# Altium schematic symbol library FPGA_Xilinx_Virtex7.SchLib: 34 symbols (part 11 of 34)
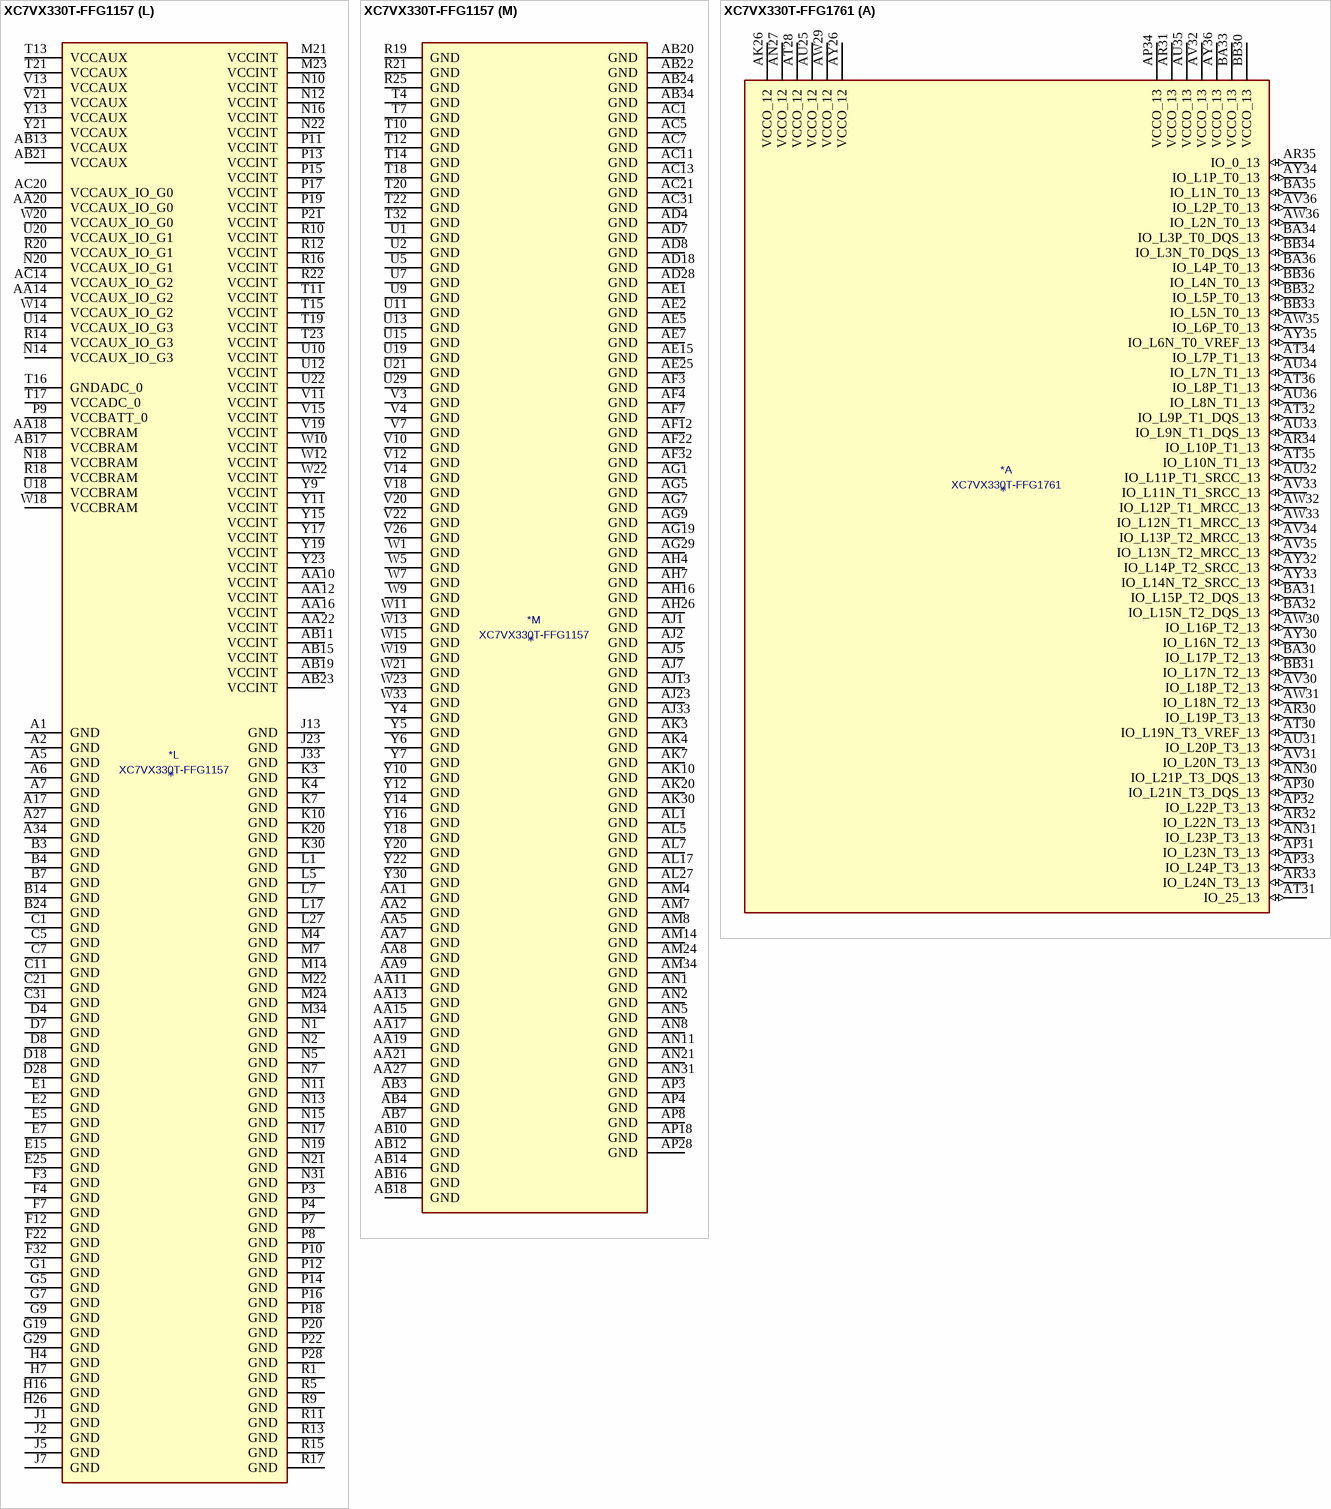
[diagram p182: symbols XC7VX330T-FFG1157 to XC7VX330T-FFG1761]

## XC7VX330T-FFG1157
designator *  value XC7VX330T-FFG1157
ki_keywords: FPGA; ki_description: Virtex 7 XT 330 XC7VX330T-FFG1157
part A pins: AC23 IO_25_VRP_15 (io), AC24 IO_L24P_T3_RS1_15 (io), AC25 IO_L23P_T3_FOE_B_15 (io), AC26 VCCO_15 (power), AC27 IO_0_VRN_15 (io), AC28 IO_L15P_T2_DQS_15 (io), AC29 IO_L15N_T2_DQS_ADV_B_15 (io), AC30 IO_L8P_T1_AD10P_15 (io), AD23 VCCO_15 (power), AD24 IO_L24N_T3_RS0_15 (io), AD25 IO_L23N_T3_FWE_B_15 (io), AD26 IO_L19P_T3_A22_15 (io), AD27 IO_L19N_T3_A21_VREF_15 (io), AD29 IO_L13P_T2_MRCC_15 (io), AD30 IO_L8N_T1_AD10N_15 (io), AD31 IO_L10P_T1_AD11P_15 (io), AD32 IO_L10N_T1_AD11N_15 (io), AD33 VCCO_15 (power), AD34 IO_L2P_T0_AD8P_15 (io), AE23 IO_L22P_T3_A17_15 (io), AE24 IO_L22N_T3_A16_15 (io), AE26 IO_L21P_T3_DQS_15 (io), AE27 IO_L16P_T2_A28_15 (io), AE28 IO_L14P_T2_SRCC_15 (io), AE29 IO_L13N_T2_MRCC_15 (io), AE30 VCCO_15 (power), AE31 IO_L12P_T1_MRCC_15 (io), AE32 IO_L7P_T1_AD2P_15 (io), AE33 IO_L7N_T1_AD2N_15 (io), AE34 IO_L2N_T0_AD8N_15 (io), AF24 IO_25_VRP_14 (io), AF25 IO_0_VRN_14 (io), AF26 IO_L21N_T3_DQS_A18_15 (io), AF27 VCCO_15 (power), AF28 IO_L16N_T2_A27_15 (io), AF29 IO_L14N_T2_SRCC_15 (io), AF30 IO_L11P_T1_SRCC_15 (io), AF31 IO_L12N_T1_MRCC_15 (io), AF33 IO_L1P_T0_AD0P_15 (io), AF34 IO_L1N_T0_AD0N_15 (io), AG24 VCCO_14 (power), AG25 IO_L16P_T2_CSI_B_14 (io), AG26 IO_L20P_T3_A20_15 (io), AG27 IO_L20N_T3_A19_15 (io), AG28 IO_L17P_T2_A26_15 (io), AG30 IO_L9P_T1_DQS_AD3P_15 (io), AG31 IO_L11N_T1_SRCC_15 (io), AG32 IO_L3P_T0_DQS_AD1P_15 (io), AG33 IO_L6P_T0_15 (io), AG34 VCCO_15 (power), AH24 IO_L17P_T2_A14_D30_14 (io), AH25 IO_L16N_T2_A15_D31_14 (io), AH27 IO_L18P_T2_A24_15 (io), AH28 IO_L18N_T2_A23_15 (io), AH29 IO_L17N_T2_A25_15 (io), AH30 IO_L9N_T1_DQS_AD3N_15 (io), AH31 VCCO_15 (power), AH32 IO_L3N_T0_DQS_AD1N_15 (io), AH33 IO_L6N_T0_VREF_15 (io), AH34 IO_L4P_T0_15 (io), AJ25 IO_L17N_T2_A13_D29_14 (io), AJ26 IO_L15P_T2_DQS_RDWR_B_14 (io), AJ27 IO_L15N_T2_DQS_DOUT_CSO_B_14 (io), AJ28 VCCO_14 (power), AJ29 IO_L10P_T1_D14_14 (io), AJ30 IO_L8P_T1_D11_14 (io), AJ31 IO_L5P_T0_AD9P_15 (io), AJ32 IO_L5N_T0_AD9N_15 (io), AJ34 IO_L4N_T0_15 (io), AK26 IO_L14P_T2_SRCC_14 (io), AK27 IO_L14N_T2_SRCC_14 (io), AK28 IO_L13P_T2_MRCC_14 (io), AK29 IO_L10N_T1_D15_14 (io), AK31 IO_L8N_T1_D12_14 (io), AK32 IO_L4P_T0_D04_14 (io), AK33 IO_L4N_T0_D05_14 (io), AK34 IO_L2P_T0_D02_14 (io), AL25 IO_L18P_T2_A12_D28_14 (io), AL26 IO_L18N_T2_A11_D27_14 (io), AL28 IO_L13N_T2_MRCC_14 (io), AL29 IO_L12P_T1_MRCC_14 (io), AL30 IO_L12N_T1_MRCC_14 (io), AL31 IO_L11P_T1_SRCC_14 (io), AL32 VCCO_14 (power), AL33 IO_L6P_T0_FCS_B_14 (io), AL34 IO_L2N_T0_D03_14 (io), AM25 IO_L21P_T3_DQS_14 (io), AM26 IO_L19P_T3_A10_D26_14 (io), AM27 IO_L19N_T3_A09_D25_VREF_14 (io), AM28 IO_L22P_T3_A05_D21_14 (io), AM29 VCCO_14 (power), AM30 IO_L9P_T1_DQS_14 (io), AM31 IO_L11N_T1_SRCC_14 (io), AM32 IO_L5P_T0_D06_14 (io), AM33 IO_L6N_T0_D08_VREF_14 (io), AN25 IO_L21N_T3_DQS_A06_D22_14 (io), AN26 VCCO_14 (power), AN27 IO_L24P_T3_A01_D17_14 (io), AN28 IO_L22N_T3_A04_D20_14 (io), AN29 IO_L20P_T3_A08_D24_14 (io), AN30 IO_L9N_T1_DQS_D13_14 (io), AN32 IO_L5N_T0_D07_14 (io), AN33 IO_L1P_T0_D00_MOSI_14 (io), AN34 IO_L1N_T0_D01_DIN_14 (io), AP25 IO_L23P_T3_A03_D19_14 (io), AP26 IO_L23N_T3_A02_D18_14 (io), AP27 IO_L24N_T3_A00_D16_14 (io), AP29 IO_L20N_T3_A07_D23_14 (io), AP30 IO_L7P_T1_D09_14 (io), AP31 IO_L7N_T1_D10_14 (io), AP32 IO_L3P_T0_DQS_PUDC_B_14 (io), AP33 IO_L3N_T0_DQS_EMCCLK_14 (io), AP34 VCCO_14 (power)
part B pins: AA23 IO_L24P_T3_16 (io), AA24 IO_L24N_T3_16 (io), AA25 IO_L23N_T3_16 (io), AA26 IO_L21P_T3_DQS_16 (io), AA28 IO_L13P_T2_MRCC_16 (io), AA29 IO_L13N_T2_MRCC_16 (io), AA30 IO_L9P_T1_DQS_16 (io), AA31 IO_L11N_T1_SRCC_16 (io), AA32 VCCO_16 (power), AA33 IO_L1P_T0_16 (io), AA34 IO_L1N_T0_16 (io), AB25 IO_25_VRP_16 (io), AB26 IO_L21N_T3_DQS_16 (io), AB27 IO_L18P_T2_16 (io), AB28 IO_L18N_T2_16 (io), AB29 VCCO_16 (power), AB30 IO_L9N_T1_DQS_16 (io), AB31 IO_L7P_T1_16 (io), AB32 IO_L7N_T1_16 (io), AB33 IO_L3P_T0_DQS_16 (io), AC32 IO_L5P_T0_16 (io), AC33 IO_L5N_T0_16 (io), AC34 IO_L3N_T0_DQS_16 (io), M30 IO_L8P_T1_17 (io), M31 IO_L8N_T1_17 (io), M32 IO_L20P_T3_17 (io), M33 IO_L20N_T3_17 (io), N23 IO_0_VRN_17 (io), N24 IO_L1P_T0_17 (io), N25 IO_L1N_T0_17 (io), N26 VCCO_17 (power), N27 IO_L2P_T0_17 (io), N28 IO_L2N_T0_17 (io), N29 IO_L7P_T1_17 (io), N30 IO_L7N_T1_17 (io), N32 IO_L19N_T3_VREF_17 (io), N33 IO_L22P_T3_17 (io), N34 IO_L22N_T3_17 (io), P23 VCCO_17 (power), P24 IO_L4P_T0_17 (io), P25 IO_L4N_T0_17 (io), P26 IO_L6P_T0_17 (io), P27 IO_L6N_T0_VREF_17 (io), P29 IO_L12P_T1_MRCC_17 (io), P30 IO_L12N_T1_MRCC_17 (io), P31 IO_L11N_T1_SRCC_17 (io), P32 IO_L19P_T3_17 (io), P33 VCCO_17 (power), P34 IO_L24N_T3_17 (io), R23 IO_L3P_T0_DQS_17 (io), R24 IO_L3N_T0_DQS_17 (io), R26 IO_L15P_T2_DQS_17 (io), R27 IO_L15N_T2_DQS_17 (io), R28 IO_L13P_T2_MRCC_17 (io), R29 IO_L13N_T2_MRCC_17 (io), R30 VCCO_17 (power), R31 IO_L11P_T1_SRCC_17 (io), R32 IO_L9N_T1_DQS_17 (io), R33 IO_L24P_T3_17 (io), R34 IO_L21N_T3_DQS_17 (io), T24 IO_L5P_T0_17 (io), T25 IO_L5N_T0_17 (io), T26 IO_L18N_T2_17 (io), T27 VCCO_17 (power), T28 IO_L16N_T2_17 (io), T29 IO_L14P_T2_SRCC_17 (io), T30 IO_L14N_T2_SRCC_17 (io), T31 IO_L9P_T1_DQS_17 (io), T33 IO_L21P_T3_DQS_17 (io), T34 IO_L23N_T3_17 (io), U23 IO_25_VRP_17 (io), U24 VCCO_16 (power), U25 IO_L18P_T2_17 (io), U26 IO_L17P_T2_17 (io), U27 IO_L17N_T2_17 (io), U28 IO_L16P_T2_17 (io), U30 IO_L8P_T1_16 (io), U31 IO_L10P_T1_17 (io), U32 IO_L10N_T1_17 (io), U33 IO_L23P_T3_17 (io), U34 VCCO_17 (power), V23 IO_0_VRN_16 (io), V24 IO_L20P_T3_16 (io), V25 IO_L20N_T3_16 (io), V27 IO_L15P_T2_DQS_16 (io), V28 IO_L15N_T2_DQS_16 (io), V29 IO_L16P_T2_16 (io), V30 IO_L8N_T1_16 (io), V31 VCCO_16 (power), V32 IO_L6P_T0_16 (io), V33 IO_L6N_T0_VREF_16 (io), V34 IO_L2P_T0_16 (io), W24 IO_L22P_T3_16 (io), W25 IO_L22N_T3_16 (io), W26 IO_L17P_T2_16 (io), W27 IO_L17N_T2_16 (io), W28 VCCO_16 (power), W29 IO_L16N_T2_16 (io), W30 IO_L12P_T1_MRCC_16 (io), W31 IO_L12N_T1_MRCC_16 (io), W32 IO_L10P_T1_16 (io), W34 IO_L2N_T0_16 (io), Y24 IO_L23P_T3_16 (io), Y25 VCCO_16 (power), Y26 IO_L19P_T3_16 (io), Y27 IO_L19N_T3_VREF_16 (io), Y28 IO_L14P_T2_SRCC_16 (io), Y29 IO_L14N_T2_SRCC_16 (io), Y31 IO_L11P_T1_SRCC_16 (io), Y32 IO_L10N_T1_16 (io), Y33 IO_L4P_T0_16 (io), Y34 IO_L4N_T0_16 (io)
part C pins: A25 IO_L8P_T1_19 (io), A26 IO_L8N_T1_19 (io), A28 IO_L15P_T2_DQS_19 (io), A29 IO_L15N_T2_DQS_19 (io), A30 IO_L17P_T2_19 (io), A31 IO_L17N_T2_19 (io), A32 VCCO_19 (power), A33 IO_L3N_T0_DQS_19 (io), B25 IO_L7N_T1_19 (io), B26 IO_L10P_T1_19 (io), B27 IO_L10N_T1_19 (io), B28 IO_L12N_T1_MRCC_19 (io), B29 VCCO_19 (power), B30 IO_L13N_T2_MRCC_19 (io), B31 IO_L1P_T0_19 (io), B32 IO_L1N_T0_19 (io), B33 IO_L3P_T0_DQS_19 (io), B34 IO_L4N_T0_19 (io), C25 IO_L7P_T1_19 (io), C26 VCCO_19 (power), C27 IO_L12P_T1_MRCC_19 (io), C28 IO_L14P_T2_SRCC_19 (io), C29 IO_L14N_T2_SRCC_19 (io), C30 IO_L13P_T2_MRCC_19 (io), C32 IO_L6N_T0_VREF_19 (io), C33 IO_L4P_T0_19 (io), C34 IO_L2N_T0_19 (io), D25 IO_L23N_T3_19 (io), D26 IO_L9N_T1_DQS_19 (io), D27 IO_L11N_T1_SRCC_19 (io), D29 IO_L16P_T2_19 (io), D30 IO_L16N_T2_19 (io), D31 IO_L5N_T0_19 (io), D32 IO_L6P_T0_19 (io), D33 VCCO_19 (power), D34 IO_L2P_T0_19 (io), E24 IO_L23P_T3_19 (io), E26 IO_L9P_T1_DQS_19 (io), E27 IO_L11P_T1_SRCC_19 (io), E28 IO_L18P_T2_19 (io), E29 IO_L18N_T2_19 (io), E30 VCCO_19 (power), E31 IO_L5P_T0_19 (io), E32 IO_L8P_T1_18 (io), E33 IO_L8N_T1_18 (io), E34 IO_L10N_T1_18 (io), F24 IO_0_VRN_19 (io), F25 IO_L21N_T3_DQS_19 (io), F26 IO_L22N_T3_19 (io), F27 VCCO_19 (power), F28 IO_L24N_T3_19 (io), F29 IO_L17N_T2_18 (io), F30 IO_L9P_T1_DQS_18 (io), F31 IO_L9N_T1_DQS_18 (io), F33 IO_L10P_T1_18 (io), F34 IO_L7N_T1_18 (io), G24 VCCO_19 (power), G25 IO_L21P_T3_DQS_19 (io), G26 IO_L22P_T3_19 (io), G27 IO_L24P_T3_19 (io), G28 IO_L17P_T2_18 (io), G30 IO_L12P_T1_MRCC_18 (io), G31 IO_L12N_T1_MRCC_18 (io), G32 IO_L11N_T1_SRCC_18 (io), G33 IO_L7P_T1_18 (io), G34 VCCO_18 (power), H24 IO_L19N_T3_VREF_19 (io), H25 IO_L20N_T3_19 (io), H27 IO_0_VRN_18 (io), H28 IO_L15N_T2_DQS_18 (io), H29 IO_L13P_T2_MRCC_18 (io), H30 IO_L13N_T2_MRCC_18 (io), H31 VCCO_18 (power), H32 IO_L11P_T1_SRCC_18 (io), H33 IO_L21P_T3_DQS_18 (io), H34 IO_L21N_T3_DQS_18 (io), J24 IO_L19P_T3_19 (io), J25 IO_L20P_T3_19 (io), J26 IO_25_VRP_19 (io), J27 IO_L15P_T2_DQS_18 (io), J28 VCCO_18 (power), J29 IO_L16N_T2_18 (io), J30 IO_L14P_T2_SRCC_18 (io), J31 IO_L14N_T2_SRCC_18 (io), J32 IO_L19N_T3_VREF_18 (io), J34 IO_L23N_T3_18 (io), K23 IO_L1N_T0_18 (io), K24 IO_L3N_T0_DQS_18 (io), K25 VCCO_18 (power), K26 IO_L5P_T0_18 (io), K27 IO_L5N_T0_18 (io), K28 IO_L16P_T2_18 (io), K29 IO_L18N_T2_18 (io), K31 IO_L19P_T3_18 (io), K32 IO_L20P_T3_18 (io), K33 IO_L20N_T3_18 (io), K34 IO_L23P_T3_18 (io), L22 VCCO_18 (power), L23 IO_L1P_T0_18 (io), L24 IO_L3P_T0_DQS_18 (io), L25 IO_L6N_T0_VREF_18 (io), L26 IO_L4N_T0_18 (io), L28 IO_L2N_T0_18 (io), L29 IO_L18P_T2_18 (io), L30 IO_L24P_T3_18 (io), L31 IO_L24N_T3_18 (io), L32 VCCO_18 (power), L33 IO_L22P_T3_18 (io), L34 IO_L22N_T3_18 (io), M25 IO_L6P_T0_18 (io), M26 IO_L4P_T0_18 (io), M27 IO_L2P_T0_18 (io), M28 IO_25_VRP_18 (io), M29 VCCO_18 (power)
part D pins: AC9 IO_L2N_T0_34 (io), AC10 IO_L2P_T0_34 (io), AC12 IO_0_VRN_34 (io), AC15 IO_25_VRP_35 (io), AC16 VCCO_35 (power), AC17 IO_L22P_T3_35 (io), AD9 IO_L4N_T0_34 (io), AD10 IO_L4P_T0_34 (io), AD11 IO_L6N_T0_VREF_34 (io), AD12 IO_L6P_T0_34 (io), AD13 VCCO_34 (power), AD14 IO_L23P_T3_35 (io), AD15 IO_L24N_T3_35 (io), AD16 IO_L24P_T3_35 (io), AD17 IO_L22N_T3_35 (io), AE8 IO_L1N_T0_34 (io), AE9 IO_L1P_T0_34 (io), AE10 VCCO_34 (power), AE11 IO_L3N_T0_DQS_34 (io), AE12 IO_L3P_T0_DQS_34 (io), AE13 IO_L23N_T3_35 (io), AE14 IO_L21P_T3_DQS_35 (io), AE16 IO_L20N_T3_35 (io), AE17 IO_L20P_T3_35 (io), AE18 IO_0_VRN_35 (io), AF8 IO_L5N_T0_34 (io), AF9 IO_L5P_T0_34 (io), AF10 IO_L10P_T1_34 (io), AF11 IO_L7P_T1_34 (io), AF13 IO_L19P_T3_35 (io), AF14 IO_L21N_T3_DQS_35 (io), AF15 IO_L16P_T2_35 (io), AF16 IO_L14P_T2_SRCC_35 (io), AF17 VCCO_35 (power), AF18 IO_L15P_T2_DQS_35 (io), AG8 IO_L8P_T1_34 (io), AG10 IO_L10N_T1_34 (io), AG11 IO_L7N_T1_34 (io), AG12 IO_L9P_T1_DQS_34 (io), AG13 IO_L19N_T3_VREF_35 (io), AG14 VCCO_35 (power), AG15 IO_L16N_T2_35 (io), AG16 IO_L14N_T2_SRCC_35 (io), AG17 IO_L13P_T2_MRCC_35 (io), AG18 IO_L15N_T2_DQS_35 (io), AH8 IO_L8N_T1_34 (io), AH9 IO_L12P_T1_MRCC_34 (io), AH10 IO_L11P_T1_SRCC_34 (io), AH11 VCCO_34 (power), AH12 IO_L9N_T1_DQS_34 (io), AH13 IO_25_VRP_34 (io), AH14 IO_L18P_T2_35 (io), AH15 IO_L12P_T1_MRCC_35 (io), AH17 IO_L13N_T2_MRCC_35 (io), AH18 IO_L17N_T2_35 (io), AH19 IO_L17P_T2_35 (io), AJ8 VCCO_34 (power), AJ9 IO_L12N_T1_MRCC_34 (io), AJ10 IO_L11N_T1_SRCC_34 (io), AJ11 IO_L13P_T2_MRCC_34 (io), AJ12 IO_L14P_T2_SRCC_34 (io), AJ14 IO_L18N_T2_35 (io), AJ15 IO_L12N_T1_MRCC_35 (io), AJ16 IO_L11P_T1_SRCC_35 (io), AJ17 IO_L10P_T1_AD15P_35 (io), AJ18 VCCO_35 (power), AK8 IO_L15P_T2_DQS_34 (io), AK9 IO_L17P_T2_34 (io), AK11 IO_L13N_T2_MRCC_34 (io), AK12 IO_L14N_T2_SRCC_34 (io), AK13 IO_L24P_T3_34 (io), AK14 IO_L9P_T1_DQS_AD7P_35 (io), AK15 VCCO_35 (power), AK16 IO_L11N_T1_SRCC_35 (io), AK17 IO_L10N_T1_AD15N_35 (io), AK18 IO_L8P_T1_AD14P_35 (io), AL8 IO_L15N_T2_DQS_34 (io), AL9 IO_L17N_T2_34 (io), AL10 IO_L16P_T2_34 (io), AL11 IO_L18P_T2_34 (io), AL12 VCCO_34 (power), AL13 IO_L24N_T3_34 (io), AL14 IO_L9N_T1_DQS_AD7N_35 (io), AL15 IO_L7P_T1_AD6P_35 (io), AL16 IO_L3P_T0_DQS_AD5P_35 (io), AL18 IO_L8N_T1_AD14N_35 (io), AM9 VCCO_34 (power), AM10 IO_L16N_T2_34 (io), AM11 IO_L18N_T2_34 (io), AM12 IO_L19P_T3_34 (io), AM13 IO_L23P_T3_34 (io), AM15 IO_L7N_T1_AD6N_35 (io), AM16 IO_L3N_T0_DQS_AD5N_35 (io), AM17 IO_L6P_T0_35 (io), AM18 IO_L2P_T0_AD12P_35 (io), AN9 IO_L20P_T3_34 (io), AN10 IO_L21P_T3_DQS_34 (io), AN12 IO_L19N_T3_VREF_34 (io), AN13 IO_L23N_T3_34 (io), AN14 IO_L5P_T0_AD13P_35 (io), AN15 IO_L1P_T0_AD4P_35 (io), AN16 VCCO_35 (power), AN17 IO_L6N_T0_VREF_35 (io), AN18 IO_L2N_T0_AD12N_35 (io), AP9 IO_L20N_T3_34 (io), AP10 IO_L21N_T3_DQS_34 (io), AP11 IO_L22N_T3_34 (io), AP12 IO_L22P_T3_34 (io), AP13 VCCO_34 (power), AP14 IO_L5N_T0_AD13N_35 (io), AP15 IO_L1N_T0_AD4N_35 (io), AP16 IO_L4N_T0_35 (io), AP17 IO_L4P_T0_35 (io)
part E pins: A19 IO_L7P_T1_37 (io), A20 IO_L7N_T1_37 (io), A21 IO_L9N_T1_DQS_37 (io), A22 VCCO_37 (power), A23 IO_L20P_T3_37 (io), A24 IO_L20N_T3_37 (io), AC18 IO_25_VRP_36 (io), AC19 IO_L19P_T3_36 (io), AC22 IO_0_VRN_36 (io), AD19 IO_L23P_T3_36 (io), AD20 IO_L19N_T3_VREF_36 (io), AD21 IO_L22P_T3_36 (io), AD22 IO_L20P_T3_36 (io), AE19 IO_L23N_T3_36 (io), AE20 VCCO_36 (power), AE21 IO_L22N_T3_36 (io), AE22 IO_L20N_T3_36 (io), AF19 IO_L21P_T3_DQS_36 (io), AF20 IO_L21N_T3_DQS_36 (io), AF21 IO_L24P_T3_36 (io), AF23 IO_L15P_T2_DQS_36 (io), AG20 IO_L18P_T2_36 (io), AG21 IO_L24N_T3_36 (io), AG22 IO_L13P_T2_MRCC_36 (io), AG23 IO_L15N_T2_DQS_36 (io), AH20 IO_L18N_T2_36 (io), AH21 VCCO_36 (power), AH22 IO_L13N_T2_MRCC_36 (io), AH23 IO_L17P_T2_36 (io), AJ19 IO_L16P_T2_36 (io), AJ20 IO_L16N_T2_36 (io), AJ21 IO_L14P_T2_SRCC_36 (io), AJ22 IO_L12P_T1_MRCC_36 (io), AJ24 IO_L17N_T2_36 (io), AK19 IO_L9P_T1_DQS_36 (io), AK21 IO_L14N_T2_SRCC_36 (io), AK22 IO_L12N_T1_MRCC_36 (io), AK23 IO_L10P_T1_36 (io), AK24 IO_L8P_T1_36 (io), AK25 VCCO_36 (power), AL19 IO_L9N_T1_DQS_36 (io), AL20 IO_L11P_T1_SRCC_36 (io), AL21 IO_L11N_T1_SRCC_36 (io), AL22 VCCO_36 (power), AL23 IO_L10N_T1_36 (io), AL24 IO_L8N_T1_36 (io), AM19 VCCO_36 (power), AM20 IO_L7P_T1_36 (io), AM21 IO_L7N_T1_36 (io), AM22 IO_L3P_T0_DQS_36 (io), AM23 IO_L6P_T0_36 (io), AN19 IO_L4P_T0_36 (io), AN20 IO_L2P_T0_36 (io), AN22 IO_L3N_T0_DQS_36 (io), AN23 IO_L6N_T0_VREF_36 (io), AN24 IO_L1P_T0_36 (io), AP19 IO_L4N_T0_36 (io), AP20 IO_L2N_T0_36 (io), AP21 IO_L5P_T0_36 (io), AP22 IO_L5N_T0_36 (io), AP23 VCCO_36 (power), AP24 IO_L1N_T0_36 (io), B19 VCCO_37 (power), B20 IO_L10N_T1_37 (io), B21 IO_L9P_T1_DQS_37 (io), B22 IO_L21N_T3_DQS_37 (io), B23 IO_L22N_T3_37 (io), C19 IO_L10P_T1_37 (io), C20 IO_L11N_T1_SRCC_37 (io), C22 IO_L21P_T3_DQS_37 (io), C23 IO_L22P_T3_37 (io), C24 IO_L24N_T3_37 (io), D19 IO_L8N_T1_37 (io), D20 IO_L11P_T1_SRCC_37 (io), D21 IO_L12N_T1_MRCC_37 (io), D22 IO_L19N_T3_VREF_37 (io), D23 VCCO_37 (power), D24 IO_L24P_T3_37 (io), E19 IO_L8P_T1_37 (io), E20 VCCO_37 (power), E21 IO_L12P_T1_MRCC_37 (io), E22 IO_L19P_T3_37 (io), E23 IO_L23N_T3_37 (io), F19 IO_L15P_T2_DQS_37 (io), F20 IO_L15N_T2_DQS_37 (io), F21 IO_L13N_T2_MRCC_37 (io), F23 IO_L23P_T3_37 (io), G20 IO_L6N_T0_VREF_37 (io), G21 IO_L13P_T2_MRCC_37 (io), G22 IO_L14N_T2_SRCC_37 (io), G23 IO_L16N_T2_37 (io), H18 IO_0_VRN_37 (io), H19 IO_L6P_T0_37 (io), H20 IO_L3N_T0_DQS_37 (io), H21 VCCO_37 (power), H22 IO_L14P_T2_SRCC_37 (io), H23 IO_L16P_T2_37 (io), J18 VCCO_37 (power), J19 IO_L4N_T0_37 (io), J20 IO_L3P_T0_DQS_37 (io), J21 IO_L17N_T2_37 (io), J22 IO_L18N_T2_37 (io), K18 IO_L4P_T0_37 (io), K19 IO_L1N_T0_37 (io), K21 IO_L17P_T2_37 (io), K22 IO_L18P_T2_37 (io), L18 IO_L2N_T0_37 (io), L19 IO_L1P_T0_37 (io), L20 IO_L5N_T0_37 (io), L21 IO_25_VRP_37 (io), M18 IO_L2P_T0_37 (io), M19 VCCO_37 (power), M20 IO_L5P_T0_37 (io)
part F pins: A8 IO_L1N_T0_39 (io), A9 IO_L1P_T0_39 (io), A10 IO_L2N_T0_39 (io), A11 IO_L2P_T0_39 (io), A12 VCCO_38 (power), A13 IO_L21N_T3_DQS_38 (io), A14 IO_L21P_T3_DQS_38 (io), A15 IO_L20N_T3_38 (io), A16 IO_L22N_T3_38 (io), A18 IO_L24N_T3_38 (io), B8 IO_L3N_T0_DQS_39 (io), B9 VCCO_39 (power), B10 IO_L4N_T0_39 (io), B11 IO_L4P_T0_39 (io), B12 IO_L6N_T0_VREF_39 (io), B13 IO_L19N_T3_VREF_38 (io), B15 IO_L23N_T3_38 (io), B16 IO_L20P_T3_38 (io), B17 IO_L22P_T3_38 (io), B18 IO_L24P_T3_38 (io), C8 IO_L5N_T0_39 (io), C9 IO_L3P_T0_DQS_39 (io), C10 IO_L10N_T1_39 (io), C12 IO_L6P_T0_39 (io), C13 IO_L19P_T3_38 (io), C14 IO_L17N_T2_38 (io), C15 IO_L23P_T3_38 (io), C16 VCCO_38 (power), C17 IO_L18N_T2_38 (io), C18 IO_L18P_T2_38 (io), D9 IO_L5P_T0_39 (io), D10 IO_L10P_T1_39 (io), D11 IO_L11N_T1_SRCC_39 (io), D12 IO_L8N_T1_39 (io), D13 VCCO_38 (power), D14 IO_L15N_T2_DQS_38 (io), D15 IO_L17P_T2_38 (io), D16 IO_L13N_T2_MRCC_38 (io), D17 IO_L14N_T2_SRCC_38 (io), E8 IO_L7N_T1_39 (io), E9 IO_L7P_T1_39 (io), E10 VCCO_39 (power), E11 IO_L11P_T1_SRCC_39 (io), E12 IO_L8P_T1_39 (io), E13 IO_L7N_T1_38 (io), E14 IO_L15P_T2_DQS_38 (io), E16 IO_L13P_T2_MRCC_38 (io), E17 IO_L14P_T2_SRCC_38 (io), E18 IO_L16N_T2_38 (io), F8 IO_L9N_T1_DQS_39 (io), F9 IO_L9P_T1_DQS_39 (io), F10 IO_L12N_T1_MRCC_39 (io), F11 IO_L12P_T1_MRCC_39 (io), F13 IO_L10N_T1_38 (io), F14 IO_L7P_T1_38 (io), F15 IO_L12N_T1_MRCC_38 (io), F16 IO_L11N_T1_SRCC_38 (io), F17 VCCO_38 (power), F18 IO_L16P_T2_38 (io), G8 IO_L18N_T2_39 (io), G10 IO_L13N_T2_MRCC_39 (io), G11 IO_L13P_T2_MRCC_39 (io), G12 IO_L16N_T2_39 (io), G13 IO_L10P_T1_38 (io), G14 VCCO_38 (power), G15 IO_L12P_T1_MRCC_38 (io), G16 IO_L11P_T1_SRCC_38 (io), G17 IO_L9N_T1_DQS_38 (io), G18 IO_25_VRP_38 (io), H8 IO_L18P_T2_39 (io), H9 IO_L14N_T2_SRCC_39 (io), H10 IO_L14P_T2_SRCC_39 (io), H11 VCCO_39 (power), H12 IO_L16P_T2_39 (io), H13 IO_0_VRN_39 (io), H14 IO_L8N_T1_38 (io), H15 IO_L1N_T0_38 (io), H17 IO_L9P_T1_DQS_38 (io), J8 VCCO_39 (power), J9 IO_L15N_T2_DQS_39 (io), J10 IO_L15P_T2_DQS_39 (io), J11 IO_L17N_T2_39 (io), J12 IO_L19N_T3_VREF_39 (io), J14 IO_L8P_T1_38 (io), J15 IO_L1P_T0_38 (io), J16 IO_L6N_T0_VREF_38 (io), J17 IO_L5N_T0_38 (io), K8 IO_25_VRP_39 (io), K9 IO_L20N_T3_39 (io), K11 IO_L17P_T2_39 (io), K12 IO_L19P_T3_39 (io), K13 IO_L21N_T3_DQS_39 (io), K14 IO_L4N_T0_38 (io), K15 VCCO_38 (power), K16 IO_L6P_T0_38 (io), K17 IO_L5P_T0_38 (io), L9 IO_L20P_T3_39 (io), L10 IO_L22N_T3_39 (io), L11 IO_L24N_T3_39 (io), L12 VCCO_39 (power), L13 IO_L21P_T3_DQS_39 (io), L14 IO_L4P_T0_38 (io), L15 IO_L2N_T0_38 (io), L16 IO_0_VRN_38 (io), M9 VCCO_39 (power), M10 IO_L22P_T3_39 (io), M11 IO_L24P_T3_39 (io), M12 IO_L23N_T3_39 (io), M13 IO_L23P_T3_39 (io), M15 IO_L2P_T0_38 (io), M16 IO_L3N_T0_DQS_38 (io), M17 IO_L3P_T0_DQS_38 (io)
part G pins: AB1 MGTHTXN3_115 (io), AB2 MGTHTXP3_115 (io), AB5 MGTREFCLK0N_115 (io), AB6 MGTREFCLK0P_115 (io), AC3 MGTHRXN3_115 (io), AC4 MGTHRXP3_115 (io), AD1 MGTHTXN2_115 (io), AD2 MGTHTXP2_115 (io), AD5 MGTREFCLK1N_115 (io), AD6 MGTREFCLK1P_115 (io), AE3 MGTHRXN2_115 (io), AE4 MGTHRXP2_115 (io), AF1 MGTHTXN1_115 (io), AF2 MGTHTXP1_115 (io), AF5 MGTHRXN1_115 (io), AF6 MGTHRXP1_115 (io), AG3 MGTHRXN0_115 (io), AG4 MGTHRXP0_115 (io), AH1 MGTHTXN0_115 (io), AH2 MGTHTXP0_115 (io), AH5 MGTREFCLK0N_114 (io), AH6 MGTREFCLK0P_114 (io), AJ3 MGTHRXN3_114 (io), AJ4 MGTHRXP3_114 (io), AK1 MGTHTXN3_114 (io), AK2 MGTHTXP3_114 (io), AK5 MGTREFCLK1N_114 (io), AK6 MGTREFCLK1P_114 (io), AL3 MGTHRXN2_114 (io), AL4 MGTHRXP2_114 (io), AM1 MGTHTXN2_114 (io), AM2 MGTHTXP2_114 (io), AM5 MGTHRXN1_114 (io), AM6 MGTHRXP1_114 (io), AN3 MGTHTXN1_114 (io), AN4 MGTHTXP1_114 (io), AP1 MGTHTXN0_114 (io), AP2 MGTHTXP0_114 (io), AP5 MGTHRXN0_114 (io), AP6 MGTHRXP0_114 (io)
part H pins: AA3 MGTHRXN0_116 (io), AA4 MGTHRXP0_116 (io), F1 MGTHTXN3_117 (io), F2 MGTHTXP3_117 (io), H1 MGTHTXN2_117 (io), H2 MGTHTXP2_117 (io), J3 MGTHRXN3_117 (io), J4 MGTHRXP3_117 (io), K1 MGTHTXN1_117 (io), K2 MGTHTXP1_117 (io), K5 MGTHRXN2_117 (io), K6 MGTHRXP2_117 (io), L3 MGTHRXN1_117 (io), L4 MGTHRXP1_117 (io), M1 MGTHTXN0_117 (io), M2 MGTHTXP0_117 (io), M5 MGTREFCLK0N_117 (io), M6 MGTREFCLK0P_117 (io), N3 MGTHRXN0_117 (io), N4 MGTHRXP0_117 (io), P1 MGTHTXN3_116 (io), P2 MGTHTXP3_116 (io), P5 MGTREFCLK1N_117 (io), P6 MGTREFCLK1P_117 (io), R3 MGTHRXN3_116 (io), R4 MGTHRXP3_116 (io), T1 MGTHTXN2_116 (io), T2 MGTHTXP2_116 (io), T5 MGTREFCLK0N_116 (io), T6 MGTREFCLK0P_116 (io), U3 MGTHRXN2_116 (io), U4 MGTHRXP2_116 (io), V1 MGTHTXN1_116 (io), V2 MGTHTXP1_116 (io), V5 MGTREFCLK1N_116 (io), V6 MGTREFCLK1P_116 (io), W3 MGTHRXN1_116 (io), W4 MGTHRXP1_116 (io), Y1 MGTHTXN0_116 (io), Y2 MGTHTXP0_116 (io)